# Altium footprint library CONN_B2B.PcbLib: 23 footprints (part 2 of 2)
Each footprint in its own frame and in the unit in brackets; x right, y up, seen from the top. Pads: shape width x height; smd on the part's side, far side on the other; paste and mask are expansions set on the pad; w line width, h text height; cw(c..) or ccw(c..) is an arc to the next point about the centre after c.
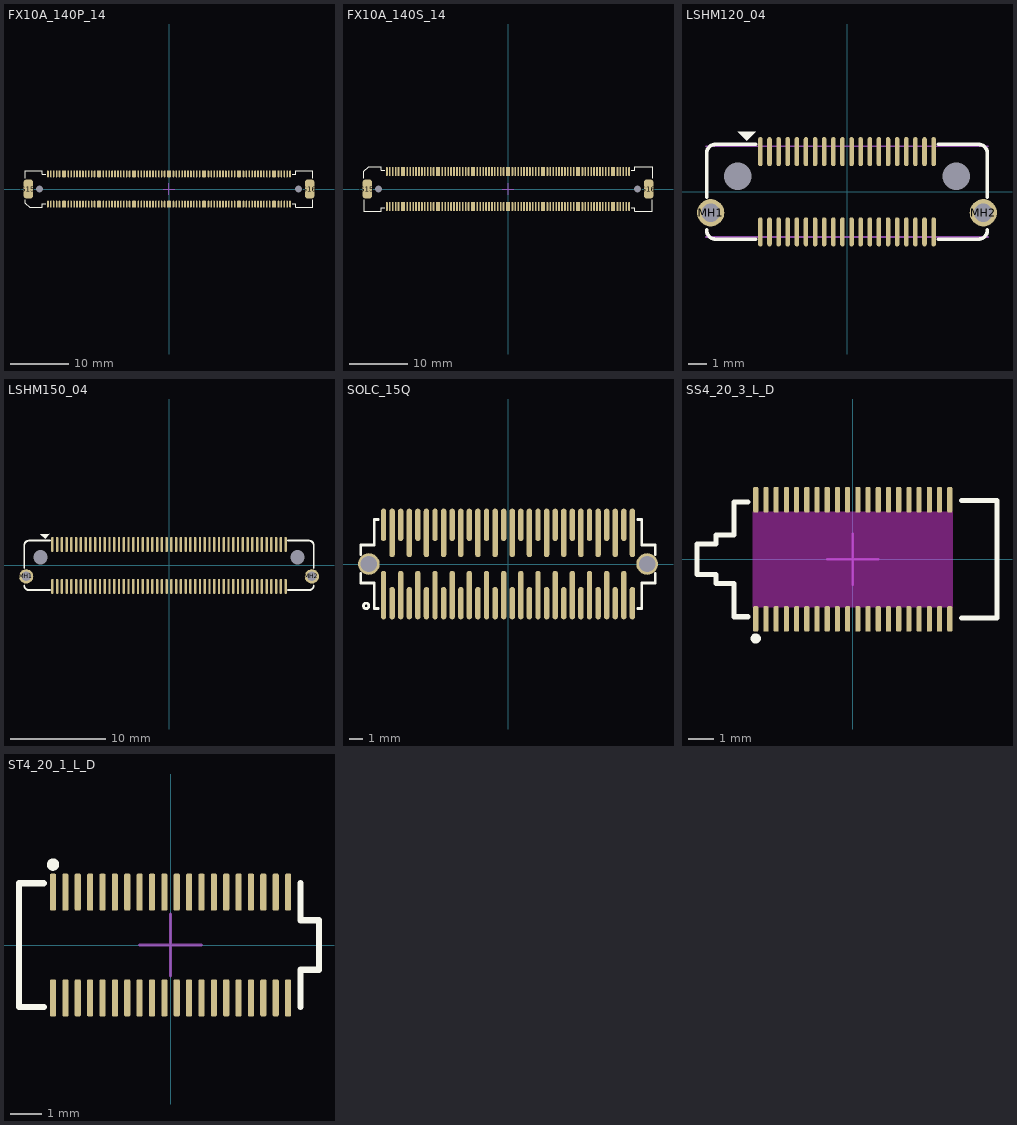
[diagram p1: the footprints below, top view; thin cyan lines are the x and y axes]

## FX10A_140P_14 [mm] "FX10A-140P/14-SV(71) HIROSE"
height 4
pads (158):
  oval 0.3x1.2 smd mask+0.075: 1(-20.75,-2.6) 2(-20.75,2.6) 3(-20.25,-2.6) 4(-20.25,2.6) 5(-19.75,-2.6) 6(-19.75,2.6) 7(-19.25,-2.6) 8(-19.25,2.6) 9(-18.75,-2.6) 10(-18.75,2.6) 11(-17.25,-2.6) 12(-17.25,2.6) 13(-16.75,-2.6) 14(-16.75,2.6) 15(-16.25,-2.6) 16(-16.25,2.6) 17(-15.75,-2.6) 18(-15.75,2.6) 19(-15.25,-2.6) 20(-15.25,2.6) 21(-14.75,-2.6) 22(-14.75,2.6) 23(-14.25,-2.6) 24(-14.25,2.6) 25(-13.75,-2.6) 26(-13.75,2.6) 27(-13.25,-2.6) 28(-13.25,2.6) 29(-12.75,-2.6) 30(-12.75,2.6) 31(-11.25,-2.6) 32(-11.25,2.6) 33(-10.75,-2.6) 34(-10.75,2.6) 35(-10.25,-2.6) 36(-10.25,2.6) 37(-9.75,-2.6) 38(-9.75,2.6) 39(-9.25,-2.6) 40(-9.25,2.6) 41(-8.75,-2.6) 42(-8.75,2.6) 43(-8.25,-2.6) 44(-8.25,2.6) 45(-7.75,-2.6) 46(-7.75,2.6) 47(-7.25,-2.6) 48(-7.25,2.6) 49(-6.75,-2.6) 50(-6.75,2.6) 51(-5.25,-2.6) 52(-5.25,2.6) 53(-4.75,-2.6) 54(-4.75,2.6) 55(-4.25,-2.6) 56(-4.25,2.6) 57(-3.75,-2.6) 58(-3.75,2.6) 59(-3.25,-2.6) 60(-3.25,2.6) 61(-2.75,-2.6) 62(-2.75,2.6) 63(-2.25,-2.6) 64(-2.25,2.6) 65(-1.75,-2.6) 66(-1.75,2.6) 67(-1.25,-2.6) 68(-1.25,2.6) 69(-0.75,-2.6) 70(-0.75,2.6) 71(0.75,-2.6) 72(0.75,2.6) 73(1.25,-2.6) 74(1.25,2.6) 75(1.75,-2.6) 76(1.75,2.6) 77(2.25,-2.6) 78(2.25,2.6) 79(2.75,-2.6) 80(2.75,2.6) 81(3.25,-2.6) 82(3.25,2.6) 83(3.75,-2.6) 84(3.75,2.6) 85(4.25,-2.6) 86(4.25,2.6) 87(4.75,-2.6) 88(4.75,2.6) 89(5.25,-2.6) 90(5.25,2.6) 91(6.75,-2.6) 92(6.75,2.6) 93(7.25,-2.6) 94(7.25,2.6) 95(7.75,-2.6) 96(7.75,2.6) 97(8.25,-2.6) 98(8.25,2.6) 99(8.75,-2.6) 100(8.75,2.6) 101(9.25,-2.6) 102(9.25,2.6) 103(9.75,-2.6) 104(9.75,2.6) 105(10.25,-2.6) 106(10.25,2.6) 107(10.75,-2.6) 108(10.75,2.6) 109(11.25,-2.6) 110(11.25,2.6) 111(12.75,-2.6) 112(12.75,2.6) 113(13.25,-2.6) 114(13.25,2.6) 115(13.75,-2.6) 116(13.75,2.6) 117(14.25,-2.6) 118(14.25,2.6) 119(14.75,-2.6) 120(14.75,2.6) 121(15.25,-2.6) 122(15.25,2.6) 123(15.75,-2.6) 124(15.75,2.6) 125(16.25,-2.6) 126(16.25,2.6) 127(16.75,-2.6) 128(16.75,2.6) 129(17.25,-2.6) 130(17.25,2.6) 131(18.75,-2.6) 132(18.75,2.6) 133(19.25,-2.6) 134(19.25,2.6) 135(19.75,-2.6) 136(19.75,2.6) 137(20.25,-2.6) 138(20.25,2.6) 139(20.75,-2.6) 140(20.75,2.6)
  rrect50% 0.7x1.2 smd mask+0.075: G1(-18,-2.6) G2(-18,2.6) G3(-12,-2.6) G4(-12,2.6) G5(-6,-2.6) G6(-6,2.6) G7(0,-2.6) G8(0,2.6) G9(6,-2.6) G10(6,2.6) G11(12,-2.6) G12(12,2.6) G13(18,-2.6) G14(18,2.6)
  rrect50% 1.6x3.2 smd mask+0.075: G15(-24.1,0) G16(24.1,0)
  round 0.5 hole 1.2 unplated: ""(-22.2,0) ""(22.2,0)
Top Overlay:
  lines w0.2: -24.6,-1.8 -24.6,-2.4 -23.9,-3.1 -21.7,-3.1 -21.7,-2.5 -21.1,-2.5 ; -24.6,1.8 -24.6,3.1 -21.7,3.1 -21.7,2.5 -21.1,2.5 ; 21.1,-2.5 21.7,-2.5 21.7,-3.1 24.6,-3.1 24.6,-1.8 ; 21.1,2.5 21.7,2.5 21.7,3.1 24.6,3.1 24.6,1.8
Mechanical 13:
  lines w0.1: -1,0 1,0 ; 0,-1 0,1
3D body "FX10A-140P14-SV.stp": height 3.51, standoff -0.59, extent -24.55,-2.95 24.55,2.95

## FX10A_140S_14 [mm] "FX10A-140S/14-SV HIROSE"
height 4
pads (158):
  oval 0.3x1.6 smd mask+0.075: 1(-20.75,3) 2(-20.75,-3) 3(-20.25,3) 4(-20.25,-3) 5(-19.75,3) 6(-19.75,-3) 7(-19.25,3) 8(-19.25,-3) 9(-18.75,3) 10(-18.75,-3) 11(-17.25,3) 12(-17.25,-3) 13(-16.75,3) 14(-16.75,-3) 15(-16.25,3) 16(-16.25,-3) 17(-15.75,3) 18(-15.75,-3) 19(-15.25,3) 20(-15.25,-3) 21(-14.75,3) 22(-14.75,-3) 23(-14.25,3) 24(-14.25,-3) 25(-13.75,3) 26(-13.75,-3) 27(-13.25,3) 28(-13.25,-3) 29(-12.75,3) 30(-12.75,-3) 31(-11.25,3) 32(-11.25,-3) 33(-10.75,3) 34(-10.75,-3) 35(-10.25,3) 36(-10.25,-3) 37(-9.75,3) 38(-9.75,-3) 39(-9.25,3) 40(-9.25,-3) 41(-8.75,3) 42(-8.75,-3) 43(-8.25,3) 44(-8.25,-3) 45(-7.75,3) 46(-7.75,-3) 47(-7.25,3) 48(-7.25,-3) 49(-6.75,3) 50(-6.75,-3) 51(-5.25,3) 52(-5.25,-3) 53(-4.75,3) 54(-4.75,-3) 55(-4.25,3) 56(-4.25,-3) 57(-3.75,3) 58(-3.75,-3) 59(-3.25,3) 60(-3.25,-3) 61(-2.75,3) 62(-2.75,-3) 63(-2.25,3) 64(-2.25,-3) 65(-1.75,3) 66(-1.75,-3) 67(-1.25,3) 68(-1.25,-3) 69(-0.75,3) 70(-0.75,-3) 71(0.75,3) 72(0.75,-3) 73(1.25,3) 74(1.25,-3) 75(1.75,3) 76(1.75,-3) 77(2.25,3) 78(2.25,-3) 79(2.75,3) 80(2.75,-3) 81(3.25,3) 82(3.25,-3) 83(3.75,3) 84(3.75,-3) 85(4.25,3) 86(4.25,-3) 87(4.75,3) 88(4.75,-3) 89(5.25,3) 90(5.25,-3) 91(6.75,3) 92(6.75,-3) 93(7.25,3) 94(7.25,-3) 95(7.75,3) 96(7.75,-3) 97(8.25,3) 98(8.25,-3) 99(8.75,3) 100(8.75,-3) 101(9.25,3) 102(9.25,-3) 103(9.75,3) 104(9.75,-3) 105(10.25,3) 106(10.25,-3) 107(10.75,3) 108(10.75,-3) 109(11.25,3) 110(11.25,-3) 111(12.75,3) 112(12.75,-3) 113(13.25,3) 114(13.25,-3) 115(13.75,3) 116(13.75,-3) 117(14.25,3) 118(14.25,-3) 119(14.75,3) 120(14.75,-3) 121(15.25,3) 122(15.25,-3) 123(15.75,3) 124(15.75,-3) 125(16.25,3) 126(16.25,-3) 127(16.75,3) 128(16.75,-3) 129(17.25,3) 130(17.25,-3) 131(18.75,3) 132(18.75,-3) 133(19.25,3) 134(19.25,-3) 135(19.75,3) 136(19.75,-3) 137(20.25,3) 138(20.25,-3) 139(20.75,3) 140(20.75,-3)
  rrect50% 0.7x1.6 smd mask+0.075: G1(-18,3) G2(-18,-3) G3(-12,3) G4(-12,-3) G5(-6,3) G6(-6,-3) G7(0,3) G8(0,-3) G9(6,3) G10(6,-3) G11(12,3) G12(12,-3) G13(18,3) G14(18,-3)
  rrect50% 1.6x3.2 smd mask+0.075: G15(-24.1,0) G16(24.1,0)
  round 0.5 hole 1.2 unplated: ""(-22.2,0) ""(22.2,0)
Top Overlay:
  lines w0.2: -24.7,-1.8 -24.7,-3.8 -21.7,-3.8 -21.7,-3.2 -21.1,-3.2 ; -24.7,1.8 -24.7,3 -23.9,3.8 -21.7,3.8 -21.7,3.2 -21.1,3.2 ; 21.1,-3.2 21.7,-3.2 21.7,-3.8 24.7,-3.8 24.7,-1.8 ; 21.1,3.2 21.7,3.2 21.7,3.8 24.7,3.8 24.7,1.8
Mechanical 13:
  lines w0.1: -1,0 1,0 ; 0,-1 0,1
3D body "FX10A-140S14-SV.stp": height 3.22, standoff -0.58, extent -24.55,-3.65 24.55,3.65

## LSHM120_04 [mm] "LSHM-120-04.0-L-DV-A-S"
pads (44):
  oval 0.25x1.6 smd mask+0.05: 1(-4.75,2.2) 2(-4.75,-2.2) 3(-4.25,2.2) 4(-4.25,-2.2) 5(-3.75,2.2) 6(-3.75,-2.2) 7(-3.25,2.2) 8(-3.25,-2.2) 9(-2.75,2.2) 10(-2.75,-2.2) 11(-2.25,2.2) 12(-2.25,-2.2) 13(-1.75,2.2) 14(-1.75,-2.2) 15(-1.25,2.2) 16(-1.25,-2.2) 17(-0.75,2.2) 18(-0.75,-2.2) 19(-0.25,2.2) 20(-0.25,-2.2) 21(0.25,2.2) 22(0.25,-2.2) 23(0.75,2.2) 24(0.75,-2.2) 25(1.25,2.2) 26(1.25,-2.2) 27(1.75,2.2) 28(1.75,-2.2) 29(2.25,2.2) 30(2.25,-2.2) 31(2.75,2.2) 32(2.75,-2.2) 33(3.25,2.2) 34(3.25,-2.2) 35(3.75,2.2) 36(3.75,-2.2) 37(4.25,2.2) 38(4.25,-2.2) 39(4.75,2.2) 40(4.75,-2.2)
  round 1.5 hole 1 mask+0.075: MH1(-7.475,-1.15) MH2(7.475,-1.15)
  round 0 hole 1.5 unplated mask+0.1: ""(-6,0.85) ""(6,0.85)
Top Overlay:
  region: -5.507,2.807 -5.014,3.3 -6,3.3
  lines w0.2: -7.7,-2.1 ccw(c-7.2,-2.1) -7.2,-2.6 -5,-2.6 ; -7.7,-0.3 -7.7,2.1 cw(c-7.2,2.1) -7.2,2.6 -5,2.6 ; 5,-2.6 7.2,-2.6 ccw(c7.2,-2.1) 7.7,-2.1 ; 5,2.6 7.2,2.6 cw(c7.2,2.1) 7.7,2.1 7.7,-0.3
Mechanical 13:
  lines w0.1: -7.725,-2.49 7.725,-2.49 ; -7.725,2.49 7.725,2.49
3D body "LSHM-120-04.0-L-DV-A-S-K-TR.stp": height 5.6, standoff -1.65, extent -7.899,-2.49 7.899,2.49

## LSHM150_04 [mm] "LSHM-150-04.0-L-DV-A-S"
pads (104):
  oval 0.25x1.6 smd mask+0.075: 1(-12.25,2.2) 2(-12.25,-2.2) 3(-11.75,2.2) 4(-11.75,-2.2) 5(-11.25,2.2) 6(-11.25,-2.2) 7(-10.75,2.2) 8(-10.75,-2.2) 9(-10.25,2.2) 10(-10.25,-2.2) 11(-9.75,2.2) 12(-9.75,-2.2) 13(-9.25,2.2) 14(-9.25,-2.2) 15(-8.75,2.2) 16(-8.75,-2.2) 17(-8.25,2.2) 18(-8.25,-2.2) 19(-7.75,2.2) 20(-7.75,-2.2) 21(-7.25,2.2) 22(-7.25,-2.2) 23(-6.75,2.2) 24(-6.75,-2.2) 25(-6.25,2.2) 26(-6.25,-2.2) 27(-5.75,2.2) 28(-5.75,-2.2) 29(-5.25,2.2) 30(-5.25,-2.2) 31(-4.75,2.2) 32(-4.75,-2.2) 33(-4.25,2.2) 34(-4.25,-2.2) 35(-3.75,2.2) 36(-3.75,-2.2) 37(-3.25,2.2) 38(-3.25,-2.2) 39(-2.75,2.2) 40(-2.75,-2.2) 41(-2.25,2.2) 42(-2.25,-2.2) 43(-1.75,2.2) 44(-1.75,-2.2) 45(-1.25,2.2) 46(-1.25,-2.2) 47(-0.75,2.2) 48(-0.75,-2.2) 49(-0.25,2.2) 50(-0.25,-2.2) 51(0.25,2.2) 52(0.25,-2.2) 53(0.75,2.2) 54(0.75,-2.2) 55(1.25,2.2) 56(1.25,-2.2) 57(1.75,2.2) 58(1.75,-2.2) 59(2.25,2.2) 60(2.25,-2.2) 61(2.75,2.2) 62(2.75,-2.2) 63(3.25,2.2) 64(3.25,-2.2) 65(3.75,2.2) 66(3.75,-2.2) 67(4.25,2.2) 68(4.25,-2.2) 69(4.75,2.2) 70(4.75,-2.2) 71(5.25,2.2) 72(5.25,-2.2) 73(5.75,2.2) 74(5.75,-2.2) 75(6.25,2.2) 76(6.25,-2.2) 77(6.75,2.2) 78(6.75,-2.2) 79(7.25,2.2) 80(7.25,-2.2) 81(7.75,2.2) 82(7.75,-2.2) 83(8.25,2.2) 84(8.25,-2.2) 85(8.75,2.2) 86(8.75,-2.2) 87(9.25,2.2) 88(9.25,-2.2) 89(9.75,2.2) 90(9.75,-2.2) 91(10.25,2.2) 92(10.25,-2.2) 93(10.75,2.2) 94(10.75,-2.2) 95(11.25,2.2) 96(11.25,-2.2) 97(11.75,2.2) 98(11.75,-2.2) 99(12.25,2.2) 100(12.25,-2.2)
  round 1.5 hole 1: MH1(-15,-1.15) MH2(15,-1.15)
  round 0 hole 1.5 unplated mask+0.1: ""(-13.5,0.85) ""(13.5,0.85)
Top Overlay:
  region: -13.007,2.807 -12.514,3.3 -13.5,3.3
  lines w0.2: -15.2,-2.1 ccw(c-14.7,-2.1) -14.7,-2.6 -12.5,-2.6 ; -15.2,-0.3 -15.2,2.1 cw(c-14.7,2.1) -14.7,2.6 -12.5,2.6 ; 12.5,-2.6 14.7,-2.6 ccw(c14.7,-2.1) 15.2,-2.1 ; 12.5,2.6 14.7,2.6 cw(c14.7,2.1) 15.2,2.1 15.2,-0.3
3D body "LSHM-150-04.0-L-DV-A-S-TR.stp": height 5.45, standoff -1.65, extent -15.399,-2.49 15.399,2.49

## SOLC_15Q [mm] "SAMTEC SOLC-115-02-S-Q-LC"
height 0.6
pads (62):
  oval 0.4x2.4 smd: A1(-8.575,-2.9) A2(-7.305,-2.9) A3(-6.035,-2.9) A4(-4.765,-2.9) A5(-3.495,-2.9) A6(-2.225,-2.9) A7(-0.955,-2.9) A8(0.315,-2.9) A9(1.585,-2.9) A10(2.855,-2.9) A11(4.125,-2.9) A12(5.395,-2.9) A13(6.665,-2.9) A14(7.935,-2.9) A15(9.205,-2.9) D1(-9.21,2.9) D2(-7.94,2.9) D3(-6.67,2.9) D4(-5.4,2.9) D5(-4.13,2.9) D6(-2.86,2.9) D7(-1.59,2.9) D8(-0.32,2.9) D9(0.95,2.9) D10(2.22,2.9) D11(3.49,2.9) D12(4.76,2.9) D13(6.03,2.9) D14(7.3,2.9) D15(8.57,2.9)
  oval 0.4x3.6 smd: B1(-9.21,-2.3) B2(-7.94,-2.3) B3(-6.67,-2.3) B4(-5.4,-2.3) B5(-4.13,-2.3) B6(-2.86,-2.3) B7(-1.59,-2.3) B8(-0.32,-2.3) B9(0.95,-2.3) B10(2.22,-2.3) B11(3.49,-2.3) B12(4.76,-2.3) B13(6.03,-2.3) B14(7.3,-2.3) B15(8.57,-2.3) C1(-8.575,2.3) C2(-7.305,2.3) C3(-6.035,2.3) C4(-4.765,2.3) C5(-3.495,2.3) C6(-2.225,2.3) C7(-0.955,2.3) C8(0.315,2.3) C9(1.585,2.3) C10(2.855,2.3) C11(4.125,2.3) C12(5.395,2.3) C13(6.665,2.3) C14(7.935,2.3) C15(9.205,2.3)
  round 1.6 / inner round 1.5 / far side oval 1.6x2.5 hole 1.2: ""(-10.3,0) ""(10.3,0)
Top Overlay:
  circle w0.2: c-10.5,-3.1 r0.2
  lines w0.2: -10.9,-0.7 -10.9,-1.4 -9.9,-1.4 -9.9,-3.3 -9.6,-3.3 ; -10.9,0.7 -10.9,1.4 -9.9,1.4 -9.9,3.3 -9.6,3.3 ; 9.6,-3.3 9.9,-3.3 9.9,-1.4 10.9,-1.4 10.9,-0.7 ; 9.6,3.3 9.9,3.3 9.9,1.4 10.9,1.4 10.9,0.7
3D body "SOLC-115-02-S-Q-LC.stp": height 4.56, standoff -1.41, extent -10.795,-3.556 10.795,3.556

## SS4_20_3_L_D [mm] "CONN, SS4-20-3.00-L-D"
pads (40):
  rrect50% 0.2x1 smd paste+0 mask+0.05: 01(-3.8,-2.335) 02(-3.8,2.335) 03(-3.4,-2.335) 04(-3.4,2.335) 05(-3,-2.335) 06(-3,2.335) 07(-2.6,-2.335) 08(-2.6,2.335) 09(-2.2,-2.335) 10(-2.2,2.335) 11(-1.8,-2.335) 12(-1.8,2.335) 13(-1.4,-2.335) 14(-1.4,2.335) 15(-1,-2.335) 16(-1,2.335) 17(-0.6,-2.335) 18(-0.6,2.335) 19(-0.2,-2.335) 20(-0.2,2.335) 21(0.2,-2.335) 22(0.2,2.335) 23(0.6,-2.335) 24(0.6,2.335) 25(1,-2.335) 26(1,2.335) 27(1.4,-2.335) 28(1.4,2.335) 29(1.8,-2.335) 30(1.8,2.335) 31(2.2,-2.335) 32(2.2,2.335) 33(2.6,-2.335) 34(2.6,2.335) 35(3,-2.335) 36(3,2.335) 37(3.4,-2.335) 38(3.4,2.335) 39(3.8,-2.335) 40(3.8,2.335)
Top Overlay:
  circle w0.2: c-3.8,-3.1 r0.1
  lines w0.2: -4.1,-2.25 -4.65,-2.25 -4.65,-0.95 -5.35,-0.95 -5.35,-0.6 -6.1,-0.6 -6.1,0.6 -5.35,0.6 -5.35,0.95 -4.65,0.95 -4.65,2.25 -4.1,2.25 ; 4.265,-2.3 5.65,-2.3 5.65,2.3 4.265,2.3
Keep-Out Layer:
  region: -3.915,1.87 3.915,1.87 3.915,-1.87 -3.915,-1.87
Mechanical 13:
  lines w0.1: -1,0 1,0 ; 0,-1 0,1
3D body "SS4-20-3.00-L-D.stp": height 3.48, standoff -0.02, extent -5.98,-2.5 5.56,2.5

## ST4_20_1_L_D [mm] "CONN, ST4-20-1.00-L-D"
pads (40):
  rrect50% 0.2x1.2 smd paste+0 mask+0.05: 1(-3.8,1.71) 2(-3.8,-1.71) 3(-3.4,1.71) 4(-3.4,-1.71) 5(-3,1.71) 6(-3,-1.71) 7(-2.6,1.71) 8(-2.6,-1.71) 9(-2.2,1.71) 10(-2.2,-1.71) 11(-1.8,1.71) 12(-1.8,-1.71) 13(-1.4,1.71) 14(-1.4,-1.71) 15(-1,1.71) 16(-1,-1.71) 17(-0.6,1.71) 18(-0.6,-1.71) 19(-0.2,1.71) 20(-0.2,-1.71) 21(0.2,1.71) 22(0.2,-1.71) 23(0.6,1.71) 24(0.6,-1.71) 25(1,1.71) 26(1,-1.71) 27(1.4,1.71) 28(1.4,-1.71) 29(1.8,1.71) 30(1.8,-1.71) 31(2.2,1.71) 32(2.2,-1.71) 33(2.6,1.71) 34(2.6,-1.71) 35(3,1.71) 36(3,-1.71) 37(3.4,1.71) 38(3.4,-1.71) 39(3.8,1.71) 40(3.8,-1.71)
Top Overlay:
  circle w0.2: c-3.8,2.6 r0.1
  lines w0.2: -4.1,-2 -4.9,-2 -4.9,2 -4.1,2 ; 4.2,-2 4.2,-0.8 4.8,-0.8 4.8,0.8 4.2,0.8 4.2,2
Mechanical 13:
  lines w0.1: -1,0 1,0 ; 0,-1 0,1
3D body "ST4-20-1.00-L-D.stp": height 3.09, standoff 0.01, extent -4.875,-2 4.705,2